# Altium footprint library LC-Standard-FootPrints-AD-V1.01.PcbLib: 585 footprints (part 37 of 37)
Each footprint in its own frame and in the unit in brackets; x right, y up, seen from the top. Pads: shape width x height; smd on the part's side, far side on the other; paste and mask are expansions set on the pad; w line width, h text height; cw(c..) or ccw(c..) is an arc to the next point about the centre after c.
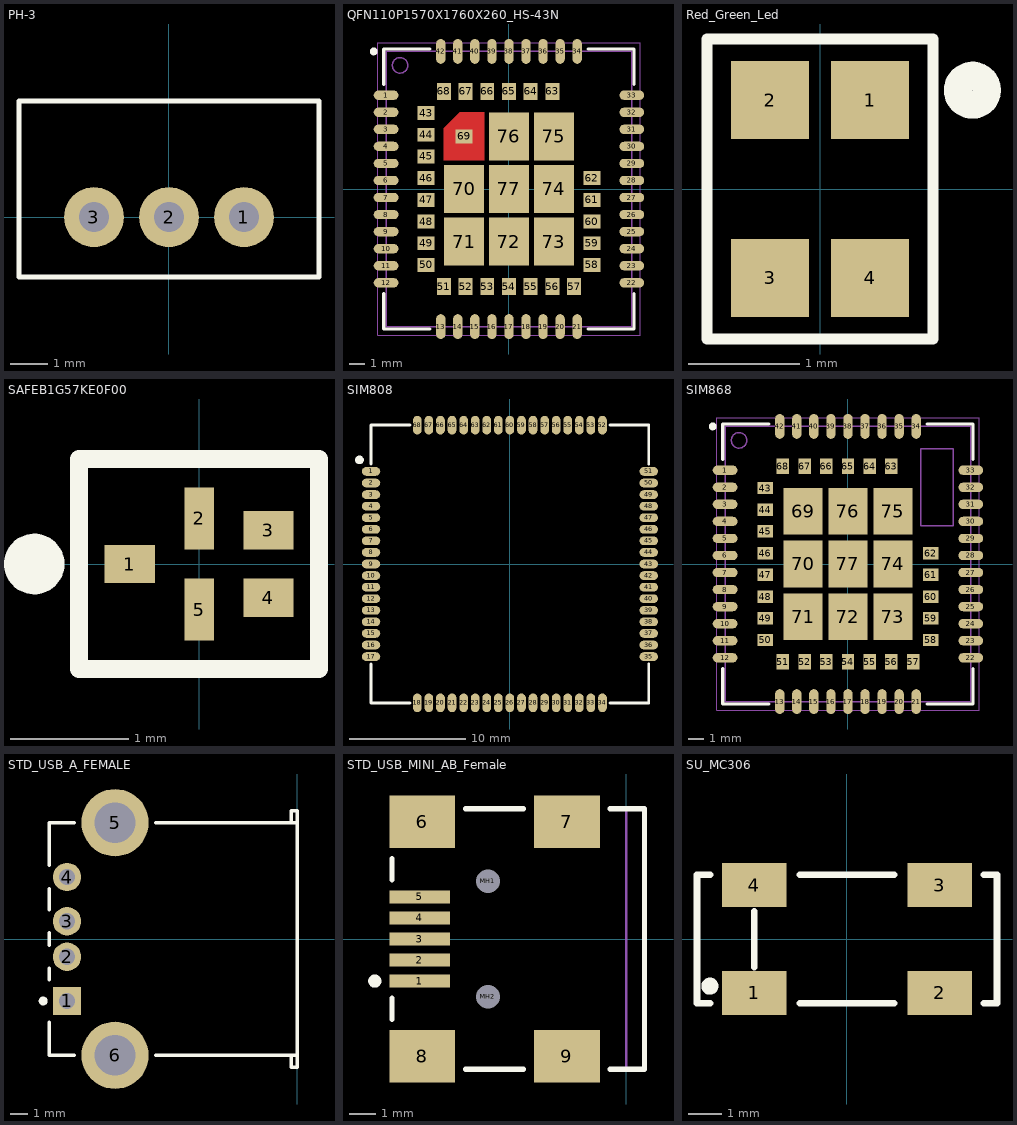
[diagram p36: the footprints below, top view; thin cyan lines are the x and y axes]

## PH-3 [mm]
pads (3):
  round 1.6 hole 0.8: 1(2,0) 2(0,0) 3(-2,0)
Top Overlay:
  lines w0.127: -4,-1.6 -4,0 -4,3.1 0,3.1 4,3.1 4,0 4,-1.6 0,-1.6 -4,-1.6

## QFN110P1570X1760X260_HS-43N [mm] "QFN, 42-Leads, Body 15.70x17.60mm, Pitch 1.10mm, Thermal Pad 9.90x13.20mm, IPC Medium Density"
height 2.6
pads (77):
  oval 1.6x0.6 smd: 1(-7.925,6.05) 2(-7.925,4.95) 3(-7.925,3.85) 4(-7.925,2.75) 5(-7.925,1.65) 6(-7.925,0.55) 7(-7.925,-0.55) 8(-7.925,-1.65) 9(-7.925,-2.75) 10(-7.925,-3.85) 11(-7.925,-4.95) 12(-7.925,-6.05) 22(7.925,-6.05) 23(7.925,-4.95) 24(7.925,-3.85) 25(7.925,-2.75) 26(7.925,-1.65) 27(7.925,-0.55) 28(7.925,0.55) 29(7.925,1.65) 30(7.925,2.75) 31(7.925,3.85) 32(7.925,4.95) 33(7.925,6.05)
  oval 0.6x1.6 smd: 13(-4.4,-8.875) 14(-3.3,-8.875) 15(-2.2,-8.875) 16(-1.1,-8.875) 17(0,-8.875) 18(1.1,-8.875) 19(2.2,-8.875) 20(3.3,-8.875) 21(4.4,-8.875) 34(4.4,8.875) 35(3.3,8.875) 36(2.2,8.875) 37(1.1,8.875) 38(0,8.875) 39(-1.1,8.875) 40(-2.2,8.875) 41(-3.3,8.875) 42(-4.4,8.875)
  rect 1.1x0.9 smd: 43(-5.35,4.9) 44(-5.35,3.5) 45(-5.35,2.1) 46(-5.35,0.7) 47(-5.35,-0.7) 48(-5.35,-2.1) 49(-5.35,-3.5) 50(-5.35,-4.9) 58(5.35,-4.9) 59(5.35,-3.5) 60(5.35,-2.1) 61(5.35,-0.7) 62(5.35,0.7) 69(-2.9,3.4)
  rect 0.9x1.1 smd: 51(-4.2,-6.3) 52(-2.8,-6.3) 53(-1.4,-6.3) 54(0,-6.3) 55(1.4,-6.3) 56(2.8,-6.3) 57(4.2,-6.3) 63(2.8,6.3) 64(1.4,6.3) 65(0,6.3) 66(-1.4,6.3) 67(-2.8,6.3) 68(-4.2,6.3)
  rect 2.6x3.1 smd: 70(-2.9,0) 71(-2.9,-3.4) 72(0,-3.4) 73(2.9,-3.4) 74(2.9,0) 75(2.9,3.4) 76(0,3.4) 77(0,0)
Top Layer:
  region: -4.2,1.85 -1.6,1.85 -1.6,4.95 -3.17,4.95 -4.2,3.92
Top Overlay:
  circle w0.25: c-8.725,8.875 r0.125
  lines w0.2: -8.075,-6.75 -8.075,-9.025 -5.1,-9.025 ; -8.075,6.75 -8.075,9.025 -5.1,9.025 ; 5.1,-9.025 8.075,-9.025 8.075,-6.75 ; 5.1,9.025 8.075,9.025 8.075,6.75
Mechanical 13:
  circle w0.1: c-7.025,7.975 r0.5
  lines w0.1: -7.925,-8.875 7.925,-8.875 7.925,8.875 -7.925,8.875 -7.925,-8.875
Mechanical 15:
  lines w0.05: -8.475,-9.425 8.475,-9.425 8.475,9.425 -8.475,9.425 -8.475,-9.425
3D body: height 2.3, standoff -0.01, extent -7.85,-8.8 7.85,8.8

## Red_Green_Led [mm]
pads (4):
  rect 0.7x0.7 smd mask+0.06: 1(0.45,0.8) 2(-0.45,0.8) 3(-0.45,-0.8) 4(0.45,-0.8)
Top Overlay:
  circle w0.254: c1.372,0.889 r0.13
  lines w0.1: -1.016,-1.35 -1.016,1.35 1.016,1.35 1.016,-1.35 -1.016,-1.35

## SAFEB1G57KE0F00 [mm]
pads (5):
  rect 0.425x0.325 smd: 1(-0.587,0) 3(0.587,0.288) 4(0.587,-0.288)
  rect 0.25x0.525 smd: 2(0,0.387) 5(0,-0.387)
Top Overlay:
  circle w0.254: c-1.397,0 r0.13
  lines w0.152: -1.016,-0.889 -1.016,0 -1.016,0.889 0,0.889 1.016,0.889 1.016,0 1.016,-0.889 0,-0.889 -1.016,-0.889

## SIM808 [mm]
pads (68):
  oval 1.6x0.75 smd: 1(-12,8) 2(-12,7) 3(-12,6) 4(-12,5) 5(-12,4) 6(-12,3) 7(-12,2) 8(-12,1) 9(-12,0) 10(-12,-1) 11(-12,-2) 12(-12,-3) 13(-12,-4) 14(-12,-5) 15(-12,-6) 16(-12,-7) 17(-12,-8) 35(12,-8) 36(12,-7) 37(12,-6) 38(12,-5) 39(12,-4) 40(12,-3) 41(12,-2) 42(12,-1) 43(12,0) 44(12,1) 45(12,2) 46(12,3) 47(12,4) 48(12,5) 49(12,6) 50(12,7) 51(12,8)
  oval 0.75x1.6 smd: 18(-8,-12) 19(-7,-12) 20(-6,-12) 21(-5,-12) 22(-4,-12) 23(-3,-12) 24(-2,-12) 25(-1,-12) 26(0,-12) 27(1,-12) 28(2,-12) 29(3,-12) 30(4,-12) 31(5,-12) 32(6,-12) 33(7,-12) 34(8,-12) 52(8,12) 53(7,12) 54(6,12) 55(5,12) 56(4,12) 57(3,12) 58(2,12) 59(1,12) 60(0,12) 61(-1,12) 62(-2,12) 63(-3,12) 64(-4,12) 65(-5,12) 66(-6,12) 67(-7,12) 68(-8,12)
Top Overlay:
  lines w0.254: -12,-8.636 -12,-12 -8.636,-12 ; -12,8.636 -12,12 -8.636,12 ; 8.636,-12 12,-12 12,-8.636 ; 8.636,12 12,12 12,8.636
  lines w0.5: -12.927,9.101 ccw(c-13,9) -12.875,9
3D body: height 3, standoff 0, extent -12,-12 12,12

## SIM868 [mm]
pads (77):
  oval 1.6x0.6 smd: 1(-7.925,6.05) 2(-7.925,4.95) 3(-7.925,3.85) 4(-7.925,2.75) 5(-7.925,1.65) 6(-7.925,0.55) 7(-7.925,-0.55) 8(-7.925,-1.65) 9(-7.925,-2.75) 10(-7.925,-3.85) 11(-7.925,-4.95) 12(-7.925,-6.05) 22(7.925,-6.05) 23(7.925,-4.95) 24(7.925,-3.85) 25(7.925,-2.75) 26(7.925,-1.65) 27(7.925,-0.55) 28(7.925,0.55) 29(7.925,1.65) 30(7.925,2.75) 31(7.925,3.85) 32(7.925,4.95) 33(7.925,6.05)
  oval 0.6x1.6 smd: 13(-4.4,-8.875) 14(-3.3,-8.875) 15(-2.2,-8.875) 16(-1.1,-8.875) 17(0,-8.875) 18(1.1,-8.875) 19(2.2,-8.875) 20(3.3,-8.875) 21(4.4,-8.875) 34(4.4,8.875) 35(3.3,8.875) 36(2.2,8.875) 37(1.1,8.875) 38(0,8.875) 39(-1.1,8.875) 40(-2.2,8.875) 41(-3.3,8.875) 42(-4.4,8.875)
  rect 1x0.8 smd: 43(-5.35,4.9) 44(-5.35,3.5) 45(-5.35,2.1) 46(-5.35,0.7) 47(-5.35,-0.7) 48(-5.35,-2.1) 49(-5.35,-3.5) 50(-5.35,-4.9) 58(5.35,-4.9) 59(5.35,-3.5) 60(5.35,-2.1) 61(5.35,-0.7) 62(5.35,0.7)
  rect 0.8x1 smd: 51(-4.2,-6.3) 52(-2.8,-6.3) 53(-1.4,-6.3) 54(0,-6.3) 55(1.4,-6.3) 56(2.8,-6.3) 57(4.2,-6.3) 63(2.8,6.3) 64(1.4,6.3) 65(0,6.3) 66(-1.4,6.3) 67(-2.8,6.3) 68(-4.2,6.3)
  rect 2.5x3 smd: 69(-2.9,3.4) 70(-2.9,0) 71(-2.9,-3.4) 72(0,-3.4) 73(2.9,-3.4) 74(2.9,0) 75(2.9,3.4) 76(0,3.4) 77(0,0)
Top Overlay:
  circle w0.25: c-8.725,8.875 r0.125
  lines w0.2: -8.075,-6.75 -8.075,-9.025 -5.1,-9.025 ; -8.075,6.75 -8.075,9.025 -5.1,9.025 ; 5.1,-9.025 8.075,-9.025 8.075,-6.75 ; 5.1,9.025 8.075,9.025 8.075,6.75
Mechanical 7:
  lines w0.102: 4.7,2.48 6.8,2.48 6.8,7.43 4.7,7.43 4.7,2.48
Mechanical 13:
  circle w0.1: c-7.025,7.975 r0.5
  lines w0.1: -7.925,-8.875 -7.925,8.875 7.925,8.875 7.925,-8.875 -7.925,-8.875
Mechanical 15:
  lines w0.05: -8.475,-9.425 -8.475,9.425 8.475,9.425 8.475,-9.425 -8.475,-9.425
3D body: height 2.3, standoff -0.01, extent -7.85,-8.8 7.85,8.8

## STD_USB_A_FEMALE [mm] "Connector; USB1.1, Type A, Thru-Hole; 4 Position; Right Angle"
height 7.01
pads (6):
  rect 1.6x1.6 hole 0.92: 1(-12.99,-3.5)
  round 1.6 hole 0.92: 2(-12.99,-1) 3(-12.99,1) 4(-12.99,3.5)
  round 3.8 hole 2.3: 5(-10.28,6.57) 6(-10.28,-6.57)
Top Overlay:
  circle w0.25: c-14.34,-3.5 r0.125
  lines w0.2: -14,-4.7 -14,-6.565 -12.58,-6.565 ; -14,-2.3 -14,-1.66 ; -14,-0.34 -14,0.34 ; -14,1.66 -14,2.84 ; -14,4.16 -14,6.565 -12.58,6.565 ; -7.98,-6.565 0,-6.565 ; -7.98,6.565 0,6.565 ; -0.32,-6.565 -0.32,-7.25 0,-7.25 0,-6.565 ; -0.32,6.565 -0.32,7.25 0,7.25 0,6.565 ; 0,-6.565 0,6.565
3D body: height 6.95, standoff -4.2, extent -14.1,-7.9 -0.4,7.9

## STD_USB_MINI_AB_Female [mm] "Connector; USB2.0, Type AB, SM; 5 Position; Right Angle"
height 3.9
pads (11):
  rect 2.3x0.5 smd: 1(-7.85,-1.6) 2(-7.85,-0.8) 3(-7.85,0) 4(-7.85,0.8) 5(-7.85,1.6)
  rect 2.5x2 smd: 6(-7.75,4.45) 7(-2.25,4.45) 8(-7.75,-4.45) 9(-2.25,-4.45)
  round 0.6 hole 0.9 unplated: MH1(-5.25,2.2) MH2(-5.25,-2.2)
Top Overlay:
  circle w0.25: c-9.55,-1.6 r0.125
  lines w0.2: -8.9,-3.05 -8.9,-2.25 ; -8.9,2.25 -8.9,3.05 ; -6.1,-4.95 -3.9,-4.95 ; -6.1,4.95 -3.9,4.95 ; -0.6,-4.95 0.7,-4.95 0.7,4.95 -0.6,4.95
Mechanical 1:
  lines w0.1: 0,-4.95 0,4.95
  text "PCB Edge" at 0.432,-4.036 h0.25
3D body: height 3.93, standoff -1, extent -8.6,-5.15 0.65,4.75

## SU_MC306 [mm]
pads (4):
  rect 1.9x1.3 smd: 1(-2.75,-1.6) 2(2.75,-1.6) 3(2.75,1.6) 4(-2.75,1.6)
Top Overlay:
  circle w0.254: c-4.064,-1.397 r0.127
  lines w0.203: -4.064,-1.905 -4.445,-1.905 -4.445,1.905 -4.064,1.905 ; -2.75,-0.838 -2.75,0.813 ; -1.397,-1.905 1.397,-1.905 ; -1.397,1.905 1.397,1.905 ; 4.064,-1.905 4.445,-1.905 4.445,-1.651 4.445,1.651 4.445,1.905 4.064,1.905
3D body: height 2.43, standoff -0.1, extent -4.096,-1.952 3.904,1.848